# Altium footprint library TEP_243-Altium_Library.PcbLib: 111 footprints (part 4 of 7)
Each footprint in its own frame and in the unit in brackets; x right, y up, seen from the top. Pads: shape width x height; smd on the part's side, far side on the other; paste and mask are expansions set on the pad; w line width, h text height; cw(c..) or ccw(c..) is an arc to the next point about the centre after c.
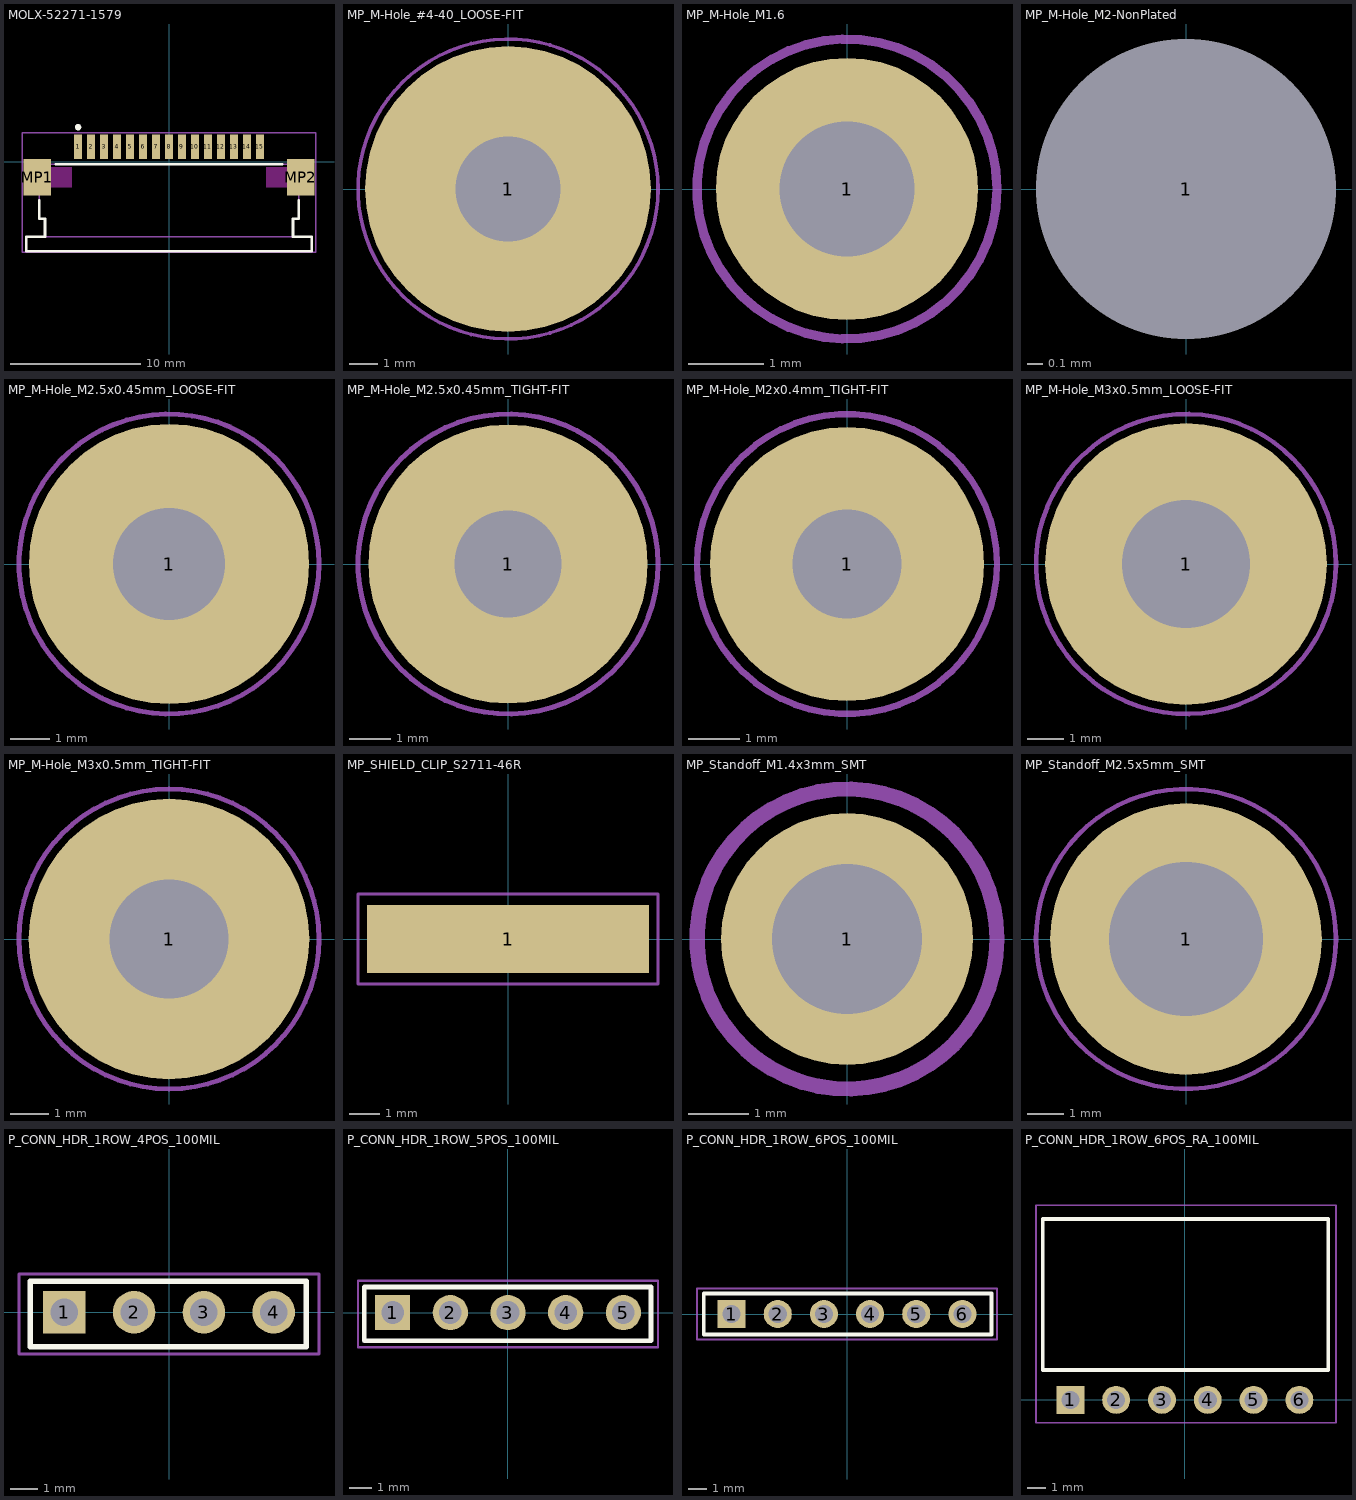
[diagram p3: the footprints below, top view; thin cyan lines are the x and y axes]

## MOLX-52271-1579 [mm] "FPC Connector, 15-Leads, Right Angle, Pitch 1.0 mm, Mated Height 3.0 mm, SMT"
height 3.012
pads (17):
  rect 0.6x1.9 smd: 1(-7,1.175) 2(-6,1.175) 3(-5,1.175) 4(-4,1.175) 5(-3,1.175) 6(-2,1.175) 7(-1,1.175) 8(0,1.175) 9(1,1.175) 10(2,1.175) 11(3,1.175) 12(4,1.175) 13(5,1.175) 14(6,1.175) 15(7,1.175)
  rect 2.1x2.8 smd: MP1(-10.15,-1.175) MP2(10.15,-1.175)
Top Overlay:
  circle w0.25: c-7,2.675 r0.125
  lines w0.2: -10,-2.975 -10,-4.375 -9.55,-4.375 -9.55,-5.775 -11,-5.775 -11,-6.875 11,-6.875 11,-5.775 9.55,-5.775 9.55,-4.375 10,-4.375 10,-2.975 ; -8.7,-0.175 8.7,-0.175
Keep-Out Layer:
  region: -7.45,-0.375 -9.1,-0.375 -9.1,-1.975 -7.45,-1.975
  rectangle: 7.45,-1.975 9.1,-0.375
Top Courtyard:
  lines w0.1: -11.3,-6.975 -11.3,2.225 11.3,2.225 11.3,-6.975 -11.3,-6.975
Top Designator:
  text ".Designator" at -3.378,-1.99 h1.5
Top 3D Body:
  lines w0.1: -9.55,-5.775 -9.55,-4.375 -10,-4.375 -10,-0.175 10,-0.175 10,-4.375 9.55,-4.375 9.55,-5.775 ; -11,-6.875 11,-6.875 11,-5.775 -11,-5.775 -11,-6.875
3D body "522711590.stp": height 3.01, standoff 0.01, extent -11,-6.875 11,1.825

## MP_M-Hole_#4-40_LOOSE-FIT [mm] "Monting Hole #4-40 Loose Fit"
height 0.01
pads (1):
  round 10.1 hole 3.7 paste-2539.97: 1(0,0)
Top Courtyard:
  circle w0.125: c0,0 r5.3

## MP_M-Hole_M1.6 [mm] "Monting Hole M1.6"
height 0.01
pads (1):
  round 3.5 hole 1.8 paste-2539.97: 1(0,0)
Top Courtyard:
  circle w0.125: c0,0 r2

## MP_M-Hole_M2-NonPlated [mm] "Monting Hole M2 non plated"
height 0.01
pads (1):
  round 1.5 hole 2 unplated paste-2539.97: 1(0,0)

## MP_M-Hole_M2.5x0.45mm_LOOSE-FIT [mm] "Monting Hole M2.5x0.45mm LOOSE Fit"
height 0.01
pads (1):
  round 7.1 hole 2.85 paste-2539.97: 1(0,0)
Top Courtyard:
  circle w0.125: c0,0 r3.8

## MP_M-Hole_M2.5x0.45mm_TIGHT-FIT [mm] "Monting Hole M2.5x0.45mm Tight Fit"
height 0.01
pads (1):
  round 6.8 hole 2.6 paste-2539.97: 1(0,0)
Top Courtyard:
  circle w0.125: c0,0 r3.65

## MP_M-Hole_M2x0.4mm_TIGHT-FIT [mm] "Monting Hole M2x0.4mm Tight Fit"
height 0.01
pads (1):
  round 5.3 hole 2.1 paste-2539.97: 1(0,0)
Top Courtyard:
  circle w0.125: c0,0 r2.9

## MP_M-Hole_M3x0.5mm_LOOSE-FIT [mm] "Monting Hole M3x0.5mm Loose Fit"
height 0.01
pads (1):
  round 7.7 hole 3.5 paste-2539.97: 1(0,0)
Top Courtyard:
  circle w0.125: c0,0 r4.1

## MP_M-Hole_M3x0.5mm_TIGHT-FIT [mm] "Monting Hole M3x0.5mm TIGHT Fit"
height 0.01
pads (1):
  round 7.3 hole 3.1 paste-2539.97: 1(0,0)
Top Courtyard:
  circle w0.125: c0,0 r3.9

## MP_SHIELD_CLIP_S2711-46R [mm] "Shield Clip Midi SMT"
height 3.55
pads (1):
  rect 9.4x2.28 smd paste-0.5: 1(0,0)
Top Courtyard:
  lines w0.1: -5,-1.5 -5,1.5 5,1.5 5,-1.5 -5,-1.5
3D body "s2711-46r.stp": height 3.45, standoff 0, extent -4.494,-1.15 4.494,1.13

## MP_Standoff_M1.4x3mm_SMT [mm] "Spacer SMT 3mm M1.4"
height 5
pads (1):
  round 4.2 hole 2.5 paste-2539.97: 1(0,0)
Top Paste:
  lines w0.8: -1.694,-0.148 cw(c0,0) -1.694,0.148 ; -1.302,-1.093 ccw(c0,0) -1.093,-1.302 ; -1.302,1.093 cw(c0,0) -1.093,1.302 ; -0.148,-1.694 ccw(c0,0) 0.148,-1.694 ; -0.148,1.694 cw(c0,0) 0.148,1.694 ; 1.093,-1.302 ccw(c0,0) 1.302,-1.093 ; 1.093,1.302 cw(c0,0) 1.302,1.093 ; 1.694,-0.148 ccw(c0,0) 1.694,0.148
Top Courtyard:
  circle w0.254: c0,0 r2.5
3D body: height 0, standoff -1.5, extent -1.25,-1.25 1.25,1.25
3D body: height 3, standoff 0, extent -2.1,-2.1 2.1,2.1
3D body: height 3.1, standoff -1.6, extent -0.7,-0.7 0.7,0.7

## MP_Standoff_M2.5x5mm_SMT [mm] "Spacer SMT 5mm M2.5"
height 5
pads (1):
  round 7.5 hole 4.26 paste-2539.97: 1(0,0)
Top Paste:
  lines w1.5: -2.631,-0.958 ccw(c0,0) -0.958,-2.631 ; -2.631,0.958 cw(c0,0) -0.958,2.631 ; 0.958,-2.631 ccw(c0,0) 2.631,-0.958 ; 0.958,2.631 cw(c0,0) 2.631,0.958
Top Courtyard:
  circle w0.125: c0,0 r4.142
3D body: height 5, standoff 0, extent -2.996,-2.996 2.996,2.996

## P_CONN_HDR_1ROW_4POS_100MIL [mm] "Header, 1x4 Pins, 2.54mm Pitch"
pads (4):
  rect 1.55x1.55 hole 1: 1(-3.81,0)
  round 1.55 hole 1: 2(-1.27,0) 3(1.27,0) 4(3.81,0)
Top Overlay:
  lines w0.2: -5.06,-1.25 5,-1.25 5,1.125 -5.06,1.125 -5.06,-1.25
Top Courtyard:
  lines w0.1: -5.461,-1.524 5.461,-1.524 5.461,1.397 -5.461,1.397 -5.461,-1.524
Top Designator:
  text ".Designator" at 0,0.188 h1

## P_CONN_HDR_1ROW_5POS_100MIL [mm] "Header, 1x5 Pins, 2.54mm Pitch"
pads (5):
  rect 1.55x1.55 hole 1: 1(-5.08,0)
  round 1.55 hole 1: 2(-2.54,0) 3(0,0) 4(2.54,0) 5(5.08,0)
Top Overlay:
  lines w0.2: -6.33,-1.25 6.295,-1.25 6.295,1.125 -6.33,1.125 -6.33,-1.25
Top Courtyard:
  lines w0.1: -6.604,-1.524 -6.604,1.397 6.604,1.397 6.604,-1.524 -6.604,-1.524
Top Designator:
  text ".Designator" at 0,0.188 h1

## P_CONN_HDR_1ROW_6POS_100MIL [mm] "Header, 1x6 Pins, 2.54mm Pitch"
pads (6):
  rect 1.55x1.55 hole 1: 1(-6.35,0)
  round 1.55 hole 1: 2(-3.81,0) 3(-1.27,0) 4(1.27,0) 5(3.81,0) 6(6.35,0)
Top Overlay:
  lines w0.2: -7.874,-1.125 7.95,-1.125 7.95,1.125 -7.874,1.125 -7.874,-1.125
Top Courtyard:
  lines w0.1: -8.255,-1.397 8.255,-1.397 8.255,1.397 -8.255,1.397 -8.255,-1.397
Top Designator:
  text ".Designator" at 0,0.188 h1

## P_CONN_HDR_1ROW_6POS_RA_100MIL [mm] "Header, 1x6 Pins, Right Angle, 2.54mm Pitch, Female"
pads (6):
  rect 1.55x1.55 hole 1: 1(-6.35,0)
  round 1.55 hole 1: 2(-3.81,0) 3(-1.27,0) 4(1.27,0) 5(3.81,0) 6(6.35,0)
Top Overlay:
  lines w0.2: -7.874,1.654 7.95,1.654 7.95,10.033 -7.874,10.033 -7.874,1.654
Top Courtyard:
  lines w0.1: -8.255,-1.27 8.382,-1.27 8.382,10.795 -8.255,10.795 -8.255,-1.27
Top Designator:
  text ".Designator" at 0,0.188 h1
3D body "SSW-106-02-T-S-RA.stp": height 2.46, standoff -2.48, extent -7.85,-0.3 7.898,9.936